# Altium footprint library tsl_Pcblib.PcbLib: 219 footprints (part 10 of 14)
Each footprint in its own frame and in the unit in brackets; x right, y up, seen from the top. Pads: shape width x height; smd on the part's side, far side on the other; paste and mask are expansions set on the pad; w line width, h text height; cw(c..) or ccw(c..) is an arc to the next point about the centre after c.
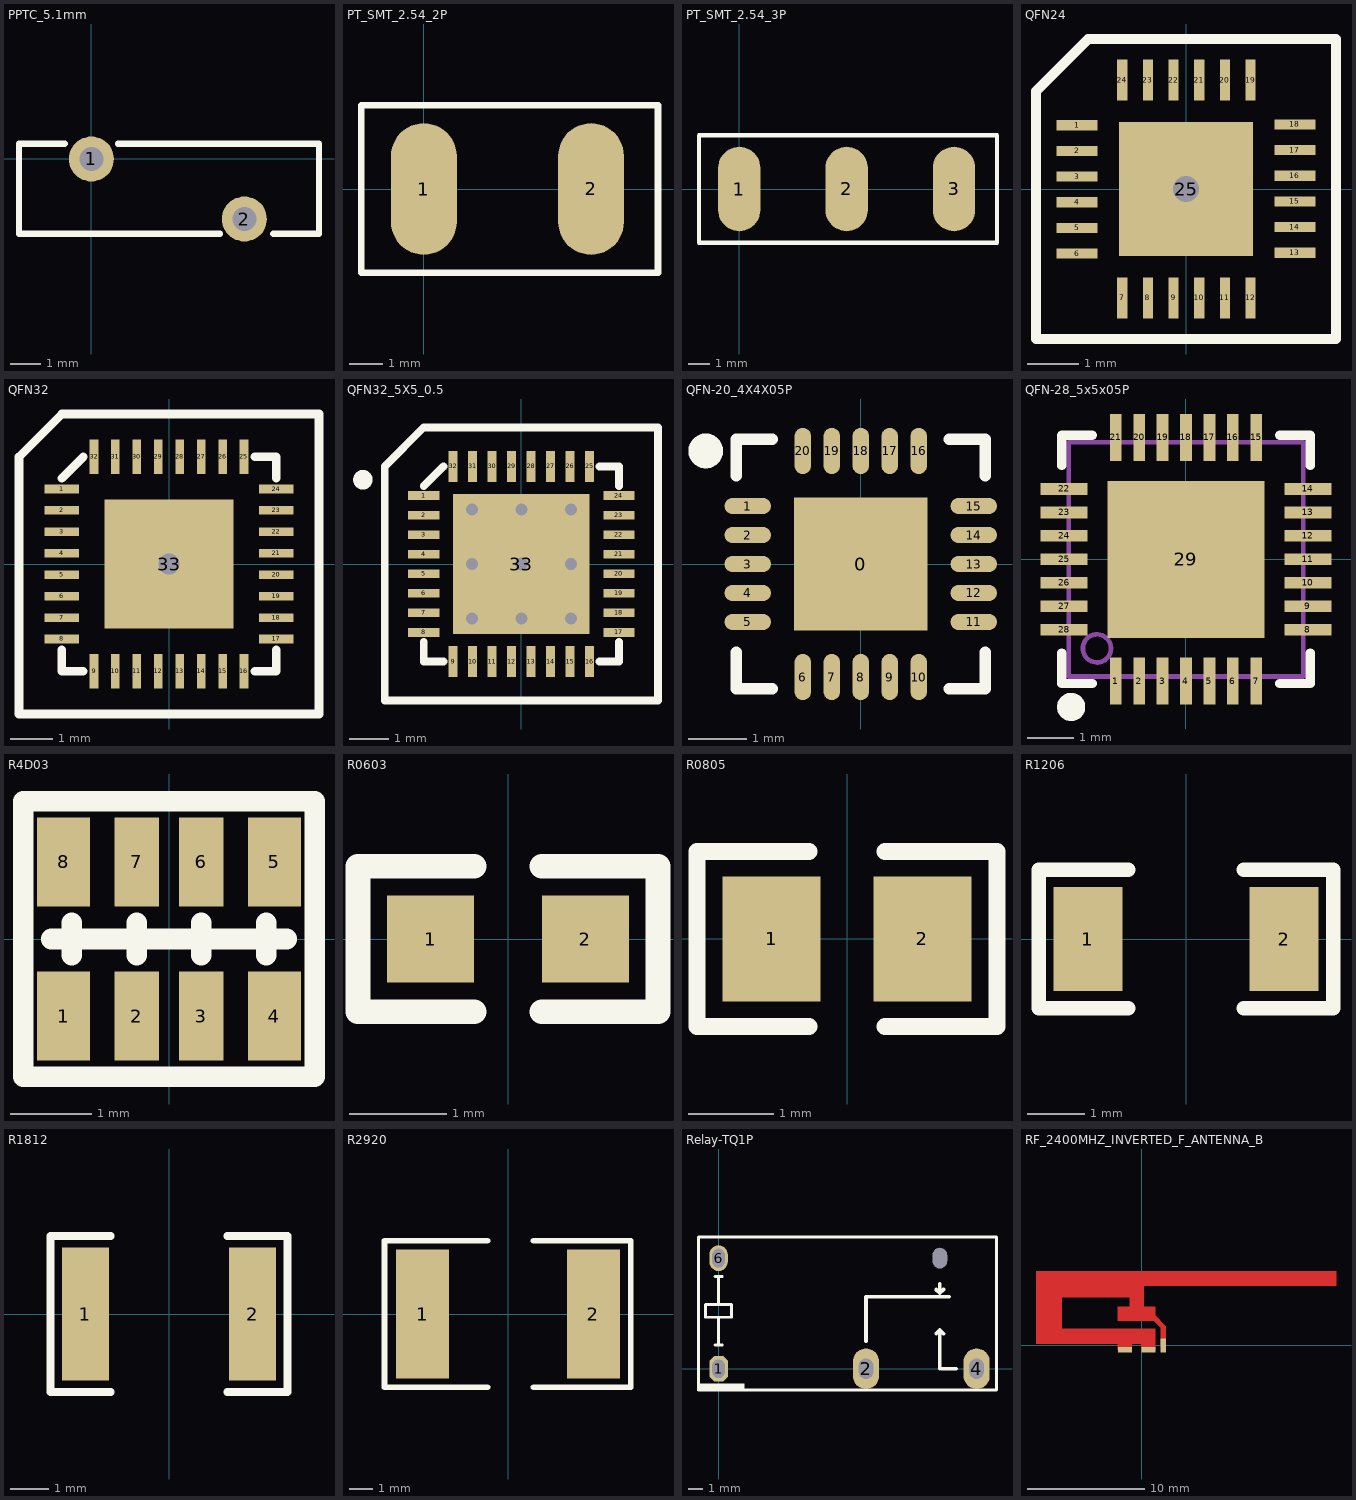
[diagram p9: the footprints below, top view; thin cyan lines are the x and y axes]

## PPTC_5.1mm [mm]
height 18.5
pads (2):
  round 1.5 hole 0.8: 1(0,0) 2(5.1,-2)
Top Overlay:
  lines w0.203: -0.889,0.508 -2.413,0.508 -2.413,-2.492 4.285,-2.492 ; 0.889,0.508 7.587,0.508 7.587,-2.492 6.063,-2.492
3D body: height 19, standoff 0, extent -2.413,-2.54 7.675,0.508

## PT_SMT_2.54_2P [mm]
pads (2):
  oval 2x4 smd: 1(0,0) 2(5.08,0)
Top Overlay:
  lines w0.203: -1.905,-2.54 -1.905,2.54 7.112,2.54 7.112,-2.54 -1.905,-2.54

## PT_SMT_2.54_3P [mm]
pads (3):
  oval 2x4 smd: 1(0,0) 2(5.08,0) 3(10.16,0)
Top Overlay:
  lines w0.203: -1.905,-2.54 12.192,-2.54 12.192,2.54 -1.905,2.54 -1.905,-2.54

## QFN24 [mm]
pads (25):
  rect 0.8x0.2 smd: 1(-2.119,1.242) 2(-2.119,0.742) 3(-2.119,0.242) 4(-2.119,-0.258) 5(-2.119,-0.758) 6(-2.119,-1.258) 13(2.119,-1.242) 14(2.119,-0.742) 15(2.119,-0.242) 16(2.119,0.258) 17(2.119,0.758) 18(2.119,1.258)
  rect 0.2x0.8 smd: 7(-1.242,-2.119) 8(-0.742,-2.119) 9(-0.242,-2.119) 10(0.258,-2.119) 11(0.758,-2.119) 12(1.258,-2.119) 19(1.258,2.119) 20(0.758,2.119) 21(0.258,2.119) 22(-0.242,2.119) 23(-0.742,2.119) 24(-1.242,2.119)
  rect 2.6x2.6 / inner rect 0.8x0.8 / far side round 0.8 hole 0.5: 25(0,0)
Top Overlay:
  lines w0.2: -2.921,-2.921 2.921,-2.921 2.921,2.921 -1.905,2.921 -2.921,1.905 -2.921,-2.921

## QFN32 [mm]
pads (33):
  rect 0.8x0.2 smd: 1(-2.5,1.75) 2(-2.5,1.25) 3(-2.5,0.75) 4(-2.5,0.25) 5(-2.5,-0.25) 6(-2.5,-0.75) 7(-2.5,-1.25) 8(-2.5,-1.75) 17(2.5,-1.75) 18(2.5,-1.25) 19(2.5,-0.75) 20(2.5,-0.25) 21(2.5,0.25) 22(2.5,0.75) 23(2.5,1.25) 24(2.5,1.75)
  rect 0.2x0.8 smd: 9(-1.75,-2.5) 10(-1.25,-2.5) 11(-0.75,-2.5) 12(-0.25,-2.5) 13(0.25,-2.5) 14(0.75,-2.5) 15(1.25,-2.5) 16(1.75,-2.5) 25(1.75,2.5) 26(1.25,2.5) 27(0.75,2.5) 28(0.25,2.5) 29(-0.25,2.5) 30(-0.75,2.5) 31(-1.25,2.5) 32(-1.75,2.5)
  rect 3x3 / inner round 0.8 / far side round 0.8 hole 0.5: 33(0,0)
Top Overlay:
  lines w0.2: -2.5,-2 -2.5,-2.5 -2,-2.5 ; -2.5,2 -2,2.5 ; 2,-2.5 2.5,-2.5 2.5,-2 ; 2,2.5 2.5,2.5 2.5,2 ; -3.5,-3.5 -3.5,2.5 -2.5,3.5 3.5,3.5 3.5,-3.5 -3.5,-3.5
3D body "User Library-qfn32-5x5.step": height 0.8, standoff 0, extent -2.54,-2.48 2.48,2.54

## QFN32_5X5_0.5 [mm]
pads (33):
  rect 0.8x0.229 smd: 1(-2.5,1.75) 2(-2.5,1.25) 3(-2.5,0.75) 4(-2.5,0.25) 5(-2.5,-0.25) 6(-2.5,-0.75) 7(-2.5,-1.25) 8(-2.5,-1.75) 17(2.5,-1.75) 18(2.5,-1.25) 19(2.5,-0.75) 20(2.5,-0.25) 21(2.5,0.25) 22(2.5,0.75) 23(2.5,1.25) 24(2.5,1.75)
  rect 0.229x0.8 smd: 9(-1.75,-2.5) 10(-1.25,-2.5) 11(-0.75,-2.5) 12(-0.25,-2.5) 13(0.25,-2.5) 14(0.75,-2.5) 15(1.25,-2.5) 16(1.75,-2.5) 25(1.75,2.5) 26(1.25,2.5) 27(0.75,2.5) 28(0.25,2.5) 29(-0.25,2.5) 30(-0.75,2.5) 31(-1.25,2.5) 32(-1.75,2.5)
  rect 3.5x3.6 smd paste-10: 33(0,0)
via -1.27,-1.397 diameter 0.61 hole 0.305
via 0,-1.397 diameter 0.61 hole 0.305
via 1.27,-1.397 diameter 0.61 hole 0.305
via 0,0 diameter 0.66 hole 0.33
via 0,1.397 diameter 0.61 hole 0.305
via -1.27,0 diameter 0.61 hole 0.305
via -1.27,1.397 diameter 0.61 hole 0.305
via 1.27,1.397 diameter 0.61 hole 0.305
via 1.27,0 diameter 0.61 hole 0.305
Top Overlay:
  circle w0.25: c-4.062,2.159 r0.125
  lines w0.2: -2.5,-2 -2.5,-2.5 -2,-2.5 ; -2.5,2 -2,2.5 ; 2,-2.5 2.5,-2.5 2.5,-2 ; 2,2.5 2.5,2.5 2.5,2 ; -3.5,-3.5 -3.5,2.5 -2.5,3.5 3.5,3.5 3.5,-3.5 -3.5,-3.5
Top Paste:
  rectangle: -1.016,0.177 -0.178,1.015
  rectangle: 0.178,0.178 1.016,1.016
  rectangle: 0.178,-1.016 1.016,-0.177
  rectangle: -1.016,-1.016 -0.178,-0.178
  rectangle: 0.177,1.372 1.016,1.753
  rectangle: -1.016,1.372 -0.178,1.753
  rectangle: -1.042,-1.753 -0.204,-1.372
  rectangle: 0.177,-1.753 1.016,-1.372
  region: 1.727,0.177 1.727,1.016 1.346,1.016 1.346,0.177
  region: 1.728,-1.016 1.728,-0.178 1.347,-0.178 1.347,-1.016
  region: -1.346,-1.016 -1.346,-0.178 -1.727,-0.178 -1.727,-1.016
  region: -1.346,0.177 -1.346,1.015 -1.727,1.015 -1.727,0.177
3D body "25R3911-QFN32-5.STEP": height 0.85, standoff 0, extent -2.501,-2.501 2.501,2.501

## QFN-20_4X4X05P [mm]
pads (21):
  rect 2.3x2.3 smd: 0(0,0)
  oval 0.8x0.28 smd: 1(-1.95,1) 2(-1.95,0.5) 3(-1.95,0) 4(-1.95,-0.5) 5(-1.95,-1) 11(1.95,-1) 12(1.95,-0.5) 13(1.95,0) 14(1.95,0.5) 15(1.95,1)
  oval 0.28x0.8 smd: 6(-1,-1.95) 7(-0.5,-1.95) 8(0,-1.95) 9(0.5,-1.95) 10(1,-1.95) 16(1,1.95) 17(0.5,1.95) 18(0,1.95) 19(-0.5,1.95) 20(-1,1.95)
Top Overlay:
  lines w0.2: -2.15,-1.525 -2.15,-2.15 -1.525,-2.15 ; -2.15,1.525 -2.15,2.15 -1.525,2.15 ; 1.525,-2.15 2.15,-2.15 2.15,-1.525 ; 1.525,2.15 2.15,2.15 2.15,1.525
  lines w0.3: -2.525,1.948 cw(c-2.675,1.949) -2.525,1.951

## QFN-28_5x5x05P [mm]
pads (29):
  rect 0.25x1 smd: 1(-1.5,-2.6) 2(-1,-2.6) 3(-0.5,-2.6) 4(0,-2.6) 5(0.5,-2.6) 6(1,-2.6) 7(1.5,-2.6) 15(1.5,2.6) 16(1,2.6) 17(0.5,2.6) 18(0,2.6) 19(-0.5,2.6) 20(-1,2.6) 21(-1.5,2.6)
  rect 1x0.25 smd: 8(2.6,-1.5) 9(2.6,-1) 10(2.6,-0.5) 11(2.6,0) 12(2.6,0.5) 13(2.6,1) 14(2.6,1.5) 22(-2.6,1.5) 23(-2.6,1) 24(-2.6,0.5) 25(-2.6,0) 26(-2.6,-0.5) 27(-2.6,-1) 28(-2.6,-1.5)
  rect 3.35x3.35 smd: 29(0,0)
Top Overlay:
  circle w0.3: c-2.45,-3.15 r0.15
  lines w0.2: -2.65,-2 -2.65,-2.65 -2,-2.65 ; -2.65,2 -2.65,2.65 -2,2.65 ; 2,-2.65 2.65,-2.65 2.65,-2 ; 2,2.65 2.65,2.65 2.65,2
Mechanical 13:
  circle w0.1: c-1.9,-1.9 r0.3
  lines w0.1: -2.5,-2.5 -2.5,2.5 2.5,2.5 2.5,-2.5 -2.5,-2.5

## R4D03 [mm]
pads (8):
  rect 0.65x1.1 smd: 1(-1.3,-0.95) 4(1.3,-0.95) 5(1.3,0.95) 8(-1.3,0.95)
  rect 0.55x1.1 smd: 2(-0.4,-0.95) 3(0.4,-0.95) 6(0.4,0.95) 7(-0.4,0.95)
Top Overlay:
  lines w0.254: -1.8,1.7 -1.8,-1.7 1.8,-1.7 1.8,1.7 -1.75,1.7 ; -1.45,0 1.45,0 ; -1.2,-0.2 -1.2,0.2 ; -0.4,-0.2 -0.4,0.2 ; 0.4,-0.2 0.4,0.2 ; 1.2,-0.2 1.2,0.2

## R0603 [mm]
pads (2):
  rect 0.9x0.9 smd: 1(-0.8,0) 2(0.8,0)
Top Overlay:
  lines w0.254: -0.35,-0.75 -1.55,-0.75 -1.55,0.75 -0.35,0.75 ; 0.35,-0.75 1.55,-0.75 1.55,0.75 0.35,0.75
3D body "User Library-RES_1609-0603.STEP": height 0.56, standoff 0, extent -0.85,-0.4 0.85,0.4

## R0805 [mm]
pads (2):
  rect 1.16x1.47 smd: 1(-0.89,0) 2(0.89,0)
Top Overlay:
  lines w0.2: -0.45,-1.035 -1.77,-1.035 -1.77,1.035 -0.45,1.035 ; 0.45,-1.035 1.77,-1.035 1.77,1.035 0.45,1.035
3D body "User Library-R_0805.STEP": height 0.49, standoff -0.01, extent -0.997,-0.625 1.003,0.625

## R1206 [mm]
pads (2):
  rect 1.2x1.8 smd: 1(-1.7,0) 2(1.7,0)
Top Overlay:
  lines w0.25: -1,-1.2 -2.55,-1.2 -2.55,1.2 -1,1.2 ; 1,-1.2 2.55,-1.2 2.55,1.2 1,1.2
3D body "User Library-R1206.step": height 0.47, standoff 0, extent -1.55,-0.776 1.55,0.776

## R1812 [mm]
pads (2):
  rect 1.2x3.42 smd: 1(-2.15,0) 2(2.15,0)
Top Overlay:
  lines w0.2: -1.5,-2.01 -3.05,-2.01 -3.05,2.01 -1.5,2.01 ; 1.5,-2.01 3.05,-2.01 3.05,2.01 1.5,2.01
3D body "R1812.STEP": height 0.59, standoff -0.01, extent -2.251,-1.6 2.249,1.6

## R2920 [mm]
pads (2):
  rect 2.3x5.6 smd: 1(-3.7,0) 2(3.7,0)
Top Overlay:
  lines w0.25: -0.89,-3.175 -5.351,-3.175 -5.351,3.175 -0.89,3.175 ; 1.11,-3.175 5.317,-3.175 5.317,3.175 1.11,3.175
3D body "User Library-FUSE-2920.step": height 1, standoff 0, extent -3.867,-2.65 3.833,2.65

## Relay-TQ1P [mm]
height 15
pads (5):
  oct 1.27x1.778 hole 0.85 slot 1.27 at 90 deg: 1(0,0)
  oval 1.8x2.8 hole 1 slot 1.4 at 90 deg: 2(10.16,0) 4(17.78,0)
  round 0 hole 1 slot 1.4 at 90 deg unplated: 5(15.24,7.62)
  oval 1.27x1.778 hole 0.85 slot 1.27 at 90 deg: 6(0,7.62)
Top Overlay:
  rectangle: -1.484,-1.524 1.778,-1.016
  lines w0.203: -0.254,1.644 0.254,1.644 ; -0.254,6.343 0.254,6.343 ; 0,1.644 0,3.549 ; 0,4.438 0,6.343 ; 19.15,-1.45 -1.37,-1.45 -1.37,9.07 19.15,9.07 19.15,-1.397 ; -0.889,3.549 -0.889,4.438 0.889,4.438 0.889,3.549 -0.889,3.549
  lines w0.254: 10.16,1.905 10.16,4.953 15.875,4.953 ; 14.986,2.413 15.24,2.667 ; 14.986,5.461 15.24,5.207 ; 15.24,0 15.24,2.667 ; 15.24,5.842 15.24,5.207 ; 15.367,0 16.383,0 ; 15.494,2.413 15.24,2.667 ; 15.494,5.461 15.24,5.207
3D body: height 12, standoff 0, extent -1.276,-1.27 18.923,8.922

## RF_2400MHZ_INVERTED_F_ANTENNA_B [mil] "RF_2400MHZ_INVERTED_F_ANTENNA_B"
pads (3):
  rect 47x18 smd: 1(-57.32,-14.17) 1(21.42,-14.17)
  rect 18x47 smd: 2(71.82,0)
Top Layer:
  region: 45.05,56.69 45.05,-14.96 -2.2,-14.96 -2.2,5.91 -33.7,5.91 -33.7,-14.57 -80.94,-14.57 -80.94,5.91 -355.74,5.91 -355.74,248.82 651.34,248.82 651.34,201.18 5.68,201.18 5.68,130.31 45.05,130.31 45.05,82.68 -80.94,82.68 -80.94,130.31 -41.57,130.31 -41.57,161.81 -269.92,161.81 -269.92,56.69
  lines w18: 38,95 71.82,61.18 71.82,0